# Altium integrated library esd_library.IntLib: 899 symbols (part 1 of 5) (continued)
## Cap Polar-220uF-10V (continued)
CAP 85C 220uF ±20% 10V WX Series Aluminum Electrolytic; MPN: UWX1A221MCL1GB; Name: Cap Polar-220uF-10V; Tan Theta: 0.2; Leakage Current: 22; Rated Ripple Current: 135; PN: 493-2098-1-ND; Diameter: 8; URL: http://www.digikey.ca/product-detail/en/UWX1A221MCL1GB/493-2098-1-ND
footprint CAPACITOR_8MM
pins: 1, 2
1 alternate drawing of the same symbol

## Cap Polar-330uF-4V
designator C?, comment Cap Pol  value 330uF  Voltage: 4V
CAP 85C 330uF ±20% 4V WX Series Aluminum Electrolytic; MPN: UWX0G331MCL1GB; Name: Cap Polar-330uF-4V; Tan Theta: 0.35; Leakage Current: 13.2; Rated Ripple Current: 145; PN: 493-2082-1-ND; Diameter: 8; URL: http://www.digikey.ca/product-detail/en/UWX0G331MCL1GB/493-2082-1-ND
footprint CAPACITOR_8MM
pins: 1, 2
1 alternate drawing of the same symbol

## Cap Polar-330uF-6.3V
designator C?, comment Cap Pol  value 330uF  Voltage: 6.3V
CAP 85C 330uF ±20% 6.3V WX Series Aluminum Electrolytic; MPN: UWX0J331MCL1GB; Name: Cap Polar-330uF-6.3V; Tan Theta: 0.26; Leakage Current: 20.79; Rated Ripple Current: 170; PN: 493-2091-1-ND; Diameter: 8; URL: http://www.digikey.ca/product-detail/en/UWX0J331MCL1GB/493-2091-1-ND
footprint CAPACITOR_8MM
pins: 1, 2
1 alternate drawing of the same symbol


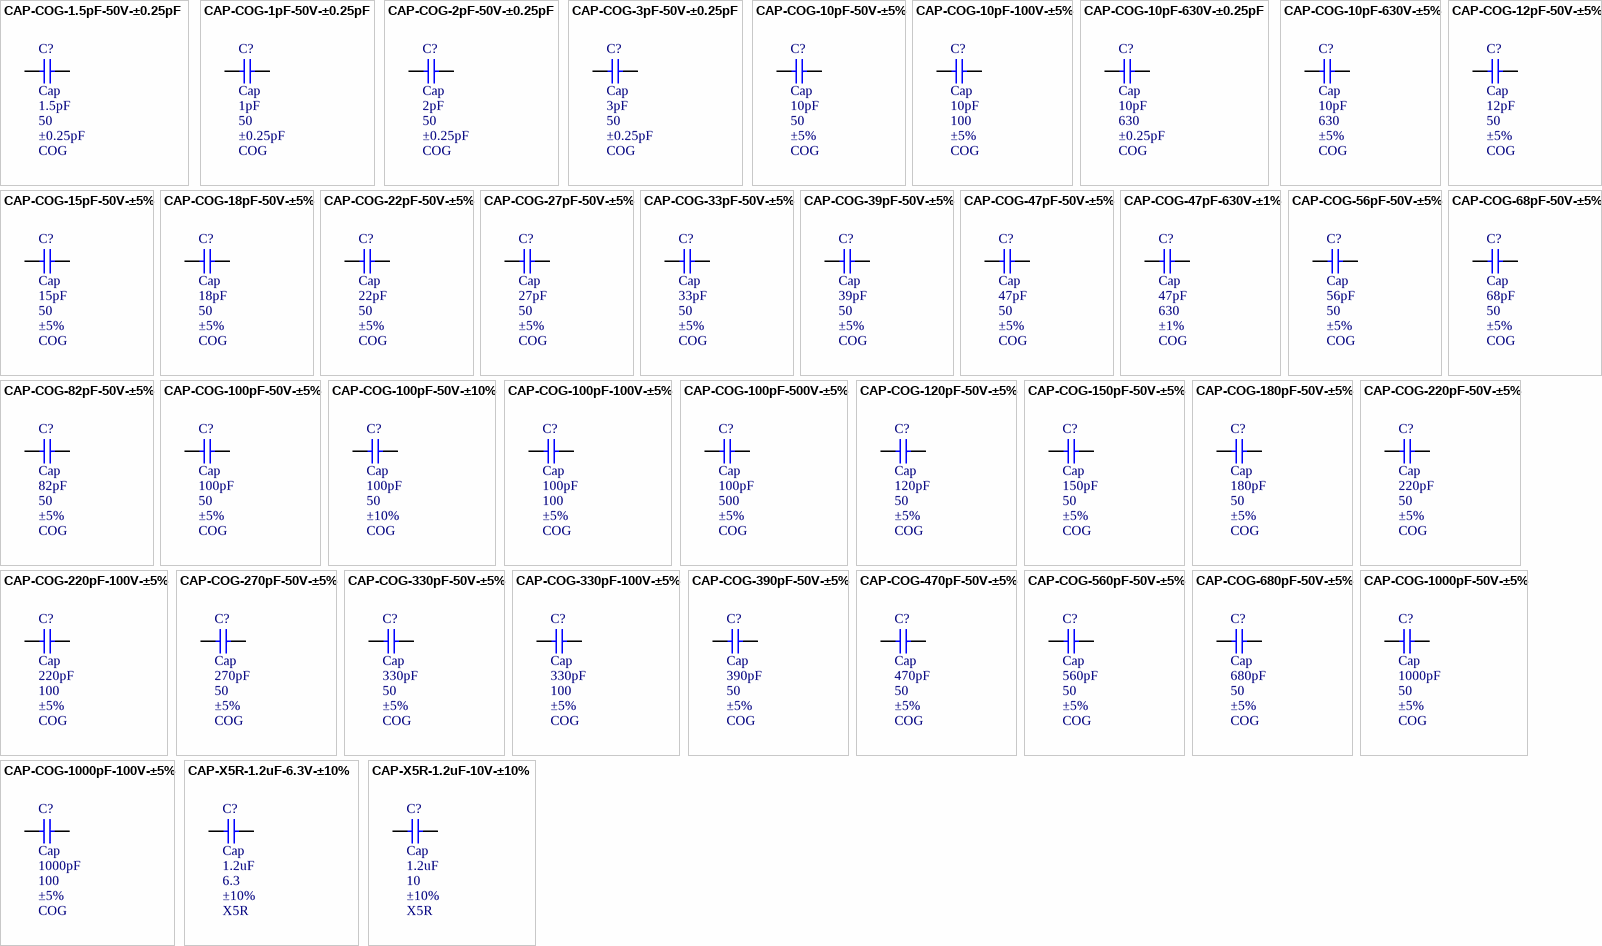
[diagram p4: symbols CAP-COG-1.5pF-50V-±0.25pF to CAP-X5R-1.2uF-10V-±10%]

## CAP-COG-1.5pF-50V-±0.25pF
designator C?, comment Cap  value 1.5pF  WV: 50  Tolerance: ±0.25pF  Type: COG
CAP CER 1.5pF 50v COG 0805; MPN: C0805C159C5GACTU; Name: CAP-COG-1.5pF-50V-±0.25pF; PN: 399-1105-1-ND; URL: http://www.digikey.ca/product-detail/en/C0805C159C5GACTU/399-1105-1-ND
footprint CAPC2012X09M (Chip Capacitor, 2-Leads, Body 2.00x1.25mm, IPC Low Density)
pins: 1, 2

## CAP-COG-1pF-50V-±0.25pF
designator C?, comment Cap  value 1pF  WV: 50  Tolerance: ±0.25pF  Type: COG
CAP CER 1pF 50v COG 0805; MPN: C0805C109C5GACTU; Name: CAP-COG-1pF-50V-±0.25pF; PN: 399-1104-1-ND; URL: http://www.digikey.ca/product-detail/en/C0805C109C5GACTU/399-1104-1-ND
footprint CAPC2012X09M (Chip Capacitor, 2-Leads, Body 2.00x1.25mm, IPC Low Density)
pins: 1, 2

## CAP-COG-2pF-50V-±0.25pF
designator C?, comment Cap  value 2pF  WV: 50  Tolerance: ±0.25pF  Type: COG
CAP CER 2pF 50v COG 0805; MPN: C0805C209C5GACTU; Name: CAP-COG-2pF-50V-±0.25pF; PN: 399-1106-1-ND; URL: http://www.digikey.ca/product-detail/en/C0805C209C5GACTU/399-1106-1-ND
footprint CAPC2012X09M (Chip Capacitor, 2-Leads, Body 2.00x1.25mm, IPC Low Density)
pins: 1, 2

## CAP-COG-3pF-50V-±0.25pF
designator C?, comment Cap  value 3pF  WV: 50  Tolerance: ±0.25pF  Type: COG
CAP CER 3pF 50v COG 0805; MPN: C0805C309C5GACTU; Name: CAP-COG-3pF-50V-±0.25pF; PN: 399-1107-1-ND; URL: http://www.digikey.ca/product-detail/en/C0805C309C5GACTU/399-1107-1-ND
footprint CAPC2012X09M (Chip Capacitor, 2-Leads, Body 2.00x1.25mm, IPC Low Density)
pins: 1, 2

## CAP-COG-10pF-50V-±5%
designator C?, comment Cap  value 10pF  WV: 50  Tolerance: ±5%  Type: COG
CAP CER 10pF 50v COG 0805; MPN: C0805C100J5GACTU; Name: CAP-COG-10pF-50V-±5%; PN: 399-1108-1-ND; URL: http://www.digikey.ca/product-detail/en/C0805C100J5GACTU/399-1108-1-ND
footprint CAPC2012X09M (Chip Capacitor, 2-Leads, Body 2.00x1.25mm, IPC Low Density)
pins: 1, 2

## CAP-COG-10pF-100V-±5%
designator C?, comment Cap  value 10pF  WV: 100  Tolerance: ±5%  Type: COG
CAP CER 10pF 100v COG 0805; MPN: C0805C100J1GACTU; Name: CAP-COG-10pF-100V-±5%; PN: 399-1109-1-ND; URL: http://www.digikey.ca/product-detail/en/C0805C100J1GACTU/399-1109-1-ND
footprint CAPC2012X09M (Chip Capacitor, 2-Leads, Body 2.00x1.25mm, IPC Low Density)
pins: 1, 2

## CAP-COG-10pF-630V-±0.25pF
designator C?, comment Cap  value 10pF  WV: 630  Tolerance: ±0.25pF  Type: COG
CAP CER 10pF 630v COG 0805; MPN: C0805C100CBGACTU; Name: CAP-COG-10pF-630V-±0.25pF; PN: 399-5538-1-ND; URL: http://www.digikey.ca/product-detail/en/C0805C100CBGACTU/399-5538-1-ND
footprint CAPC2012X09M (Chip Capacitor, 2-Leads, Body 2.00x1.25mm, IPC Low Density)
pins: 1, 2

## CAP-COG-10pF-630V-±5%
designator C?, comment Cap  value 10pF  WV: 630  Tolerance: ±5%  Type: COG
CAP CER 10pF 630v COG 0805; MPN: C0805C100JBGACTU; Name: CAP-COG-10pF-630V-±5%; PN: 399-5539-1-ND; URL: http://www.digikey.ca/product-detail/en/C0805C100JBGACTU/399-5539-1-ND
footprint CAPC2012X09M (Chip Capacitor, 2-Leads, Body 2.00x1.25mm, IPC Low Density)
pins: 1, 2

## CAP-COG-12pF-50V-±5%
designator C?, comment Cap  value 12pF  WV: 50  Tolerance: ±5%  Type: COG
CAP CER 12pF 50v COG 0805; MPN: C0805C120J5GACTU; Name: CAP-COG-12pF-50V-±5%; PN: 399-1110-1-ND; URL: http://www.digikey.ca/product-detail/en/C0805C120J5GACTU/399-1110-1-ND
footprint CAPC2012X09M (Chip Capacitor, 2-Leads, Body 2.00x1.25mm, IPC Low Density)
pins: 1, 2

## CAP-COG-15pF-50V-±5%
designator C?, comment Cap  value 15pF  WV: 50  Tolerance: ±5%  Type: COG
CAP CER 15pF 50v COG 0805; MPN: C0805C150J5GACTU; Name: CAP-COG-15pF-50V-±5%; PN: 399-1111-1-ND; URL: http://www.digikey.ca/product-detail/en/C0805C150J5GACTU/399-1111-1-ND
footprint CAPC2012X09M (Chip Capacitor, 2-Leads, Body 2.00x1.25mm, IPC Low Density)
pins: 1, 2

## CAP-COG-18pF-50V-±5%
designator C?, comment Cap  value 18pF  WV: 50  Tolerance: ±5%  Type: COG
CAP CER 18pF 50v COG 0805; MPN: C0805C180J5GACTU; Name: CAP-COG-18pF-50V-±5%; PN: 399-1112-1-ND; URL: http://www.digikey.ca/product-detail/en/C0805C180J5GACTU/399-1112-1-ND
footprint CAPC2012X09M (Chip Capacitor, 2-Leads, Body 2.00x1.25mm, IPC Low Density)
pins: 1, 2

## CAP-COG-22pF-50V-±5%
designator C?, comment Cap  value 22pF  WV: 50  Tolerance: ±5%  Type: COG
CAP CER 22pF 50v COG 0805; MPN: C0805C220J5GACTU; Name: CAP-COG-22pF-50V-±5%; PN: 399-1113-1-ND; URL: http://www.digikey.ca/product-detail/en/C0805C220J5GACTU/399-1113-1-ND
footprint CAPC2012X09M (Chip Capacitor, 2-Leads, Body 2.00x1.25mm, IPC Low Density)
pins: 1, 2

## CAP-COG-27pF-50V-±5%
designator C?, comment Cap  value 27pF  WV: 50  Tolerance: ±5%  Type: COG
CAP CER 27pF 50v COG 0805; MPN: C0805C270J5GACTU; Name: CAP-COG-27pF-50V-±5%; PN: 399-1114-1-ND; URL: http://www.digikey.ca/product-detail/en/C0805C270J5GACTU/399-1114-1-ND
footprint CAPC2012X09M (Chip Capacitor, 2-Leads, Body 2.00x1.25mm, IPC Low Density)
pins: 1, 2

## CAP-COG-33pF-50V-±5%
designator C?, comment Cap  value 33pF  WV: 50  Tolerance: ±5%  Type: COG
CAP CER 33pF 50v COG 0805; MPN: C0805C330J5GACTU; Name: CAP-COG-33pF-50V-±5%; PN: 399-1115-1-ND; URL: http://www.digikey.ca/product-detail/en/C0805C330J5GACTU/399-1115-1-ND
footprint CAPC2012X09M (Chip Capacitor, 2-Leads, Body 2.00x1.25mm, IPC Low Density)
pins: 1, 2

## CAP-COG-39pF-50V-±5%
designator C?, comment Cap  value 39pF  WV: 50  Tolerance: ±5%  Type: COG
CAP CER 39pF 50v COG 0805; MPN: C0805C390J5GACTU; Name: CAP-COG-39pF-50V-±5%; PN: 399-1116-1-ND; URL: http://www.digikey.ca/product-detail/en/C0805C390J5GACTU/399-1116-1-ND
footprint CAPC2012X09M (Chip Capacitor, 2-Leads, Body 2.00x1.25mm, IPC Low Density)
pins: 1, 2

## CAP-COG-47pF-50V-±5%
designator C?, comment Cap  value 47pF  WV: 50  Tolerance: ±5%  Type: COG
CAP CER 47pF 50v COG 0805; MPN: C0805C470J5GACTU; Name: CAP-COG-47pF-50V-±5%; PN: 399-1117-1-ND; URL: http://www.digikey.ca/product-detail/en/C0805C470J5GACTU/399-1117-1-ND
footprint CAPC2012X09M (Chip Capacitor, 2-Leads, Body 2.00x1.25mm, IPC Low Density)
pins: 1, 2

## CAP-COG-47pF-630V-±1%
designator C?, comment Cap  value 47pF  WV: 630  Tolerance: ±1%  Type: COG
CAP CER 47pF 630v COG 0805; MPN: C0805C470FBGACTU; Name: CAP-COG-47pF-630V-±1%; PN: 399-5537-1-ND; URL: http://www.digikey.ca/product-detail/en/C0805C470FBGACTU/399-5537-1-ND
footprint CAPC2012X09M (Chip Capacitor, 2-Leads, Body 2.00x1.25mm, IPC Low Density)
pins: 1, 2

## CAP-COG-56pF-50V-±5%
designator C?, comment Cap  value 56pF  WV: 50  Tolerance: ±5%  Type: COG
CAP CER 56pF 50v COG 0805; MPN: C0805C560J5GACTU; Name: CAP-COG-56pF-50V-±5%; PN: 399-1118-1-ND; URL: http://www.digikey.ca/product-detail/en/C0805C560J5GACTU/399-1118-1-ND
footprint CAPC2012X09M (Chip Capacitor, 2-Leads, Body 2.00x1.25mm, IPC Low Density)
pins: 1, 2

## CAP-COG-68pF-50V-±5%
designator C?, comment Cap  value 68pF  WV: 50  Tolerance: ±5%  Type: COG
CAP CER 68pF 50v COG 0805; MPN: C0805C680J5GACTU; Name: CAP-COG-68pF-50V-±5%; PN: 399-1119-1-ND; URL: http://www.digikey.ca/product-detail/en/C0805C680J5GACTU/399-1119-1-ND
footprint CAPC2012X09M (Chip Capacitor, 2-Leads, Body 2.00x1.25mm, IPC Low Density)
pins: 1, 2

## CAP-COG-82pF-50V-±5%
designator C?, comment Cap  value 82pF  WV: 50  Tolerance: ±5%  Type: COG
CAP CER 82pF 50v COG 0805; MPN: C0805C820J5GACTU; Name: CAP-COG-82pF-50V-±5%; PN: 399-1120-1-ND; URL: http://www.digikey.ca/product-detail/en/C0805C820J5GACTU/399-1120-1-ND
footprint CAPC2012X09M (Chip Capacitor, 2-Leads, Body 2.00x1.25mm, IPC Low Density)
pins: 1, 2

## CAP-COG-100pF-50V-±5%
designator C?, comment Cap  value 100pF  WV: 50  Tolerance: ±5%  Type: COG
CAP CER 100pF 50v COG 0805; MPN: C0805C101J5GACTU; Name: CAP-COG-100pF-50V-±5%; PN: 399-1122-1-ND; URL: http://www.digikey.ca/product-detail/en/C0805C101J5GACTU/399-1122-1-ND
footprint CAPC2012X09M (Chip Capacitor, 2-Leads, Body 2.00x1.25mm, IPC Low Density)
pins: 1, 2

## CAP-COG-100pF-50V-±10%
designator C?, comment Cap  value 100pF  WV: 50  Tolerance: ±10%  Type: COG
CAP CER 100pF 50v COG 0805; MPN: C0805C101K5GACTU; Name: CAP-COG-100pF-50V-±10%; PN: 399-1121-1-ND; URL: http://www.digikey.ca/product-detail/en/C0805C101K5GACTU/399-1121-1-ND
footprint CAPC2012X09M (Chip Capacitor, 2-Leads, Body 2.00x1.25mm, IPC Low Density)
pins: 1, 2

## CAP-COG-100pF-100V-±5%
designator C?, comment Cap  value 100pF  WV: 100  Tolerance: ±5%  Type: COG
CAP CER 100pF 100v COG 0805; MPN: C0805C101J1GACTU; Name: CAP-COG-100pF-100V-±5%; PN: 399-1123-1-ND; URL: http://www.digikey.ca/product-detail/en/C0805C101J1GACTU/399-1123-1-ND
footprint CAPC2012X09M (Chip Capacitor, 2-Leads, Body 2.00x1.25mm, IPC Low Density)
pins: 1, 2

## CAP-COG-100pF-500V-±5%
designator C?, comment Cap  value 100pF  WV: 500  Tolerance: ±5%  Type: COG
CAP CER 100pF 500v COG 0805; MPN: C0805C101JCGACTU; Name: CAP-COG-100pF-500V-±5%; PN: 399-5102-1-ND; URL: http://www.digikey.ca/product-detail/en/C0805C101JCGACTU/399-5102-1-ND
footprint CAPC2012X09M (Chip Capacitor, 2-Leads, Body 2.00x1.25mm, IPC Low Density)
pins: 1, 2

## CAP-COG-120pF-50V-±5%
designator C?, comment Cap  value 120pF  WV: 50  Tolerance: ±5%  Type: COG
CAP CER 120pF 50v COG 0805; MPN: C0805C121J5GACTU; Name: CAP-COG-120pF-50V-±5%; PN: 399-1124-1-ND; URL: http://www.digikey.ca/product-detail/en/C0805C121J5GACTU/399-1124-1-ND
footprint CAPC2012X09M (Chip Capacitor, 2-Leads, Body 2.00x1.25mm, IPC Low Density)
pins: 1, 2

## CAP-COG-150pF-50V-±5%
designator C?, comment Cap  value 150pF  WV: 50  Tolerance: ±5%  Type: COG
CAP CER 150pF 50v COG 0805; MPN: C0805C151J5GACTU; Name: CAP-COG-150pF-50V-±5%; PN: 399-1125-1-ND; URL: http://www.digikey.ca/product-detail/en/C0805C151J5GACTU/399-1125-1-ND
footprint CAPC2012X09M (Chip Capacitor, 2-Leads, Body 2.00x1.25mm, IPC Low Density)
pins: 1, 2

## CAP-COG-180pF-50V-±5%
designator C?, comment Cap  value 180pF  WV: 50  Tolerance: ±5%  Type: COG
CAP CER 180pF 50v COG 0805; MPN: C0805C181J5GACTU; Name: CAP-COG-180pF-50V-±5%; PN: 399-1126-1-ND; URL: http://www.digikey.ca/product-detail/en/C0805C181J5GACTU/399-1126-1-ND
footprint CAPC2012X09M (Chip Capacitor, 2-Leads, Body 2.00x1.25mm, IPC Low Density)
pins: 1, 2

## CAP-COG-220pF-50V-±5%
designator C?, comment Cap  value 220pF  WV: 50  Tolerance: ±5%  Type: COG
CAP CER 220pF 50v COG 0805; MPN: C0805C221J5GACTU; Name: CAP-COG-220pF-50V-±5%; PN: 399-1127-1-ND; URL: http://www.digikey.ca/product-detail/en/C0805C221J5GACTU/399-1127-1-ND
footprint CAPC2012X09M (Chip Capacitor, 2-Leads, Body 2.00x1.25mm, IPC Low Density)
pins: 1, 2

## CAP-COG-220pF-100V-±5%
designator C?, comment Cap  value 220pF  WV: 100  Tolerance: ±5%  Type: COG
CAP CER 220pF 100v COG 0805; MPN: C0805C221J1GACTU; Name: CAP-COG-220pF-100V-±5%; PN: 399-1128-1-ND; URL: http://www.digikey.ca/product-detail/en/C0805C221J1GACTU/399-1128-1-ND
footprint CAPC2012X09M (Chip Capacitor, 2-Leads, Body 2.00x1.25mm, IPC Low Density)
pins: 1, 2

## CAP-COG-270pF-50V-±5%
designator C?, comment Cap  value 270pF  WV: 50  Tolerance: ±5%  Type: COG
CAP CER 270pF 50v COG 0805; MPN: C0805C271J5GACTU; Name: CAP-COG-270pF-50V-±5%; PN: 399-1129-1-ND; URL: http://www.digikey.ca/product-detail/en/C0805C271J5GACTU/399-1129-1-ND
footprint CAPC2012X09M (Chip Capacitor, 2-Leads, Body 2.00x1.25mm, IPC Low Density)
pins: 1, 2

## CAP-COG-330pF-50V-±5%
designator C?, comment Cap  value 330pF  WV: 50  Tolerance: ±5%  Type: COG
CAP CER 330pF 50v COG 0805; MPN: C0805C331J5GACTU; Name: CAP-COG-330pF-50V-±5%; PN: 399-1130-1-ND; URL: http://www.digikey.ca/product-detail/en/C0805C331J5GACTU/399-1130-1-ND
footprint CAPC2012X09M (Chip Capacitor, 2-Leads, Body 2.00x1.25mm, IPC Low Density)
pins: 1, 2

## CAP-COG-330pF-100V-±5%
designator C?, comment Cap  value 330pF  WV: 100  Tolerance: ±5%  Type: COG
CAP CER 330pF 100v COG 0805; MPN: C0805C331J1GACTU; Name: CAP-COG-330pF-100V-±5%; PN: 399-1131-1-ND; URL: http://www.digikey.ca/product-detail/en/C0805C331J1GACTU/399-1131-1-ND
footprint CAPC2012X09M (Chip Capacitor, 2-Leads, Body 2.00x1.25mm, IPC Low Density)
pins: 1, 2

## CAP-COG-390pF-50V-±5%
designator C?, comment Cap  value 390pF  WV: 50  Tolerance: ±5%  Type: COG
CAP CER 390pF 50v COG 0805; MPN: C0805C391J5GACTU; Name: CAP-COG-390pF-50V-±5%; PN: 399-1132-1-ND; URL: http://www.digikey.ca/product-detail/en/C0805C391J5GACTU/399-1132-1-ND
footprint CAPC2012X09M (Chip Capacitor, 2-Leads, Body 2.00x1.25mm, IPC Low Density)
pins: 1, 2

## CAP-COG-470pF-50V-±5%
designator C?, comment Cap  value 470pF  WV: 50  Tolerance: ±5%  Type: COG
CAP CER 470pF 50v COG 0805; MPN: C0805C471J5GACTU; Name: CAP-COG-470pF-50V-±5%; PN: 399-1133-1-ND; URL: http://www.digikey.ca/product-detail/en/C0805C471J5GACTU/399-1133-1-ND
footprint CAPC2012X09M (Chip Capacitor, 2-Leads, Body 2.00x1.25mm, IPC Low Density)
pins: 1, 2

## CAP-COG-560pF-50V-±5%
designator C?, comment Cap  value 560pF  WV: 50  Tolerance: ±5%  Type: COG
CAP CER 560pF 50v COG 0805; MPN: C0805C561J5GACTU; Name: CAP-COG-560pF-50V-±5%; PN: 399-1134-1-ND; URL: http://www.digikey.ca/product-detail/en/C0805C561J5GACTU/399-1134-1-ND
footprint CAPC2012X09M (Chip Capacitor, 2-Leads, Body 2.00x1.25mm, IPC Low Density)
pins: 1, 2

## CAP-COG-680pF-50V-±5%
designator C?, comment Cap  value 680pF  WV: 50  Tolerance: ±5%  Type: COG
CAP CER 680pF 50v COG 0805; MPN: C0805C681J5GACTU; Name: CAP-COG-680pF-50V-±5%; PN: 399-1135-1-ND; URL: http://www.digikey.ca/product-detail/en/C0805C681J5GACTU/399-1135-1-ND
footprint CAPC2012X09M (Chip Capacitor, 2-Leads, Body 2.00x1.25mm, IPC Low Density)
pins: 1, 2

## CAP-COG-1000pF-50V-±5%
designator C?, comment Cap  value 1000pF  WV: 50  Tolerance: ±5%  Type: COG
CAP CER 1000pF 50v COG 0805; MPN: C0805C102J5GACTU; Name: CAP-COG-1000pF-50V-±5%; PN: 399-1136-1-ND; URL: http://www.digikey.ca/product-detail/en/C0805C102J5GACTU/399-1136-1-ND
footprint CAPC2012X09M (Chip Capacitor, 2-Leads, Body 2.00x1.25mm, IPC Low Density)
pins: 1, 2

## CAP-COG-1000pF-100V-±5%
designator C?, comment Cap  value 1000pF  WV: 100  Tolerance: ±5%  Type: COG
CAP CER 1000pF 100v COG 0805; MPN: C0805C102J1GACTU; Name: CAP-COG-1000pF-100V-±5%; PN: 399-1137-1-ND; URL: http://www.digikey.ca/product-detail/en/C0805C102J1GACTU/399-1137-1-ND
footprint CAPC2012X09M (Chip Capacitor, 2-Leads, Body 2.00x1.25mm, IPC Low Density)
pins: 1, 2

## CAP-X5R-1.2uF-6.3V-±10%
designator C?, comment Cap  value 1.2uF  WV: 6.3  Tolerance: ±10%  Type: X5R
CAP CER 1.2uF 6.3v X5R 0805; MPN: C0805C125K9PACTU; Name: CAP-X5R-1.2uF-6.3V-±10%; PN: 399-3120-1-ND; URL: http://www.digikey.ca/product-detail/en/C0805C125K9PACTU/399-3120-1-ND
footprint CAPC2012X09M (Chip Capacitor, 2-Leads, Body 2.00x1.25mm, IPC Low Density)
pins: 1, 2

## CAP-X5R-1.2uF-10V-±10%
designator C?, comment Cap  value 1.2uF  WV: 10  Tolerance: ±10%  Type: X5R
CAP CER 1.2uF 10v X5R 0805; MPN: C0805C125K8PACTU; Name: CAP-X5R-1.2uF-10V-±10%; PN: 399-3119-1-ND; URL: http://www.digikey.ca/product-detail/en/C0805C125K8PACTU/399-3119-1-ND
footprint CAPC2012X09M (Chip Capacitor, 2-Leads, Body 2.00x1.25mm, IPC Low Density)
pins: 1, 2

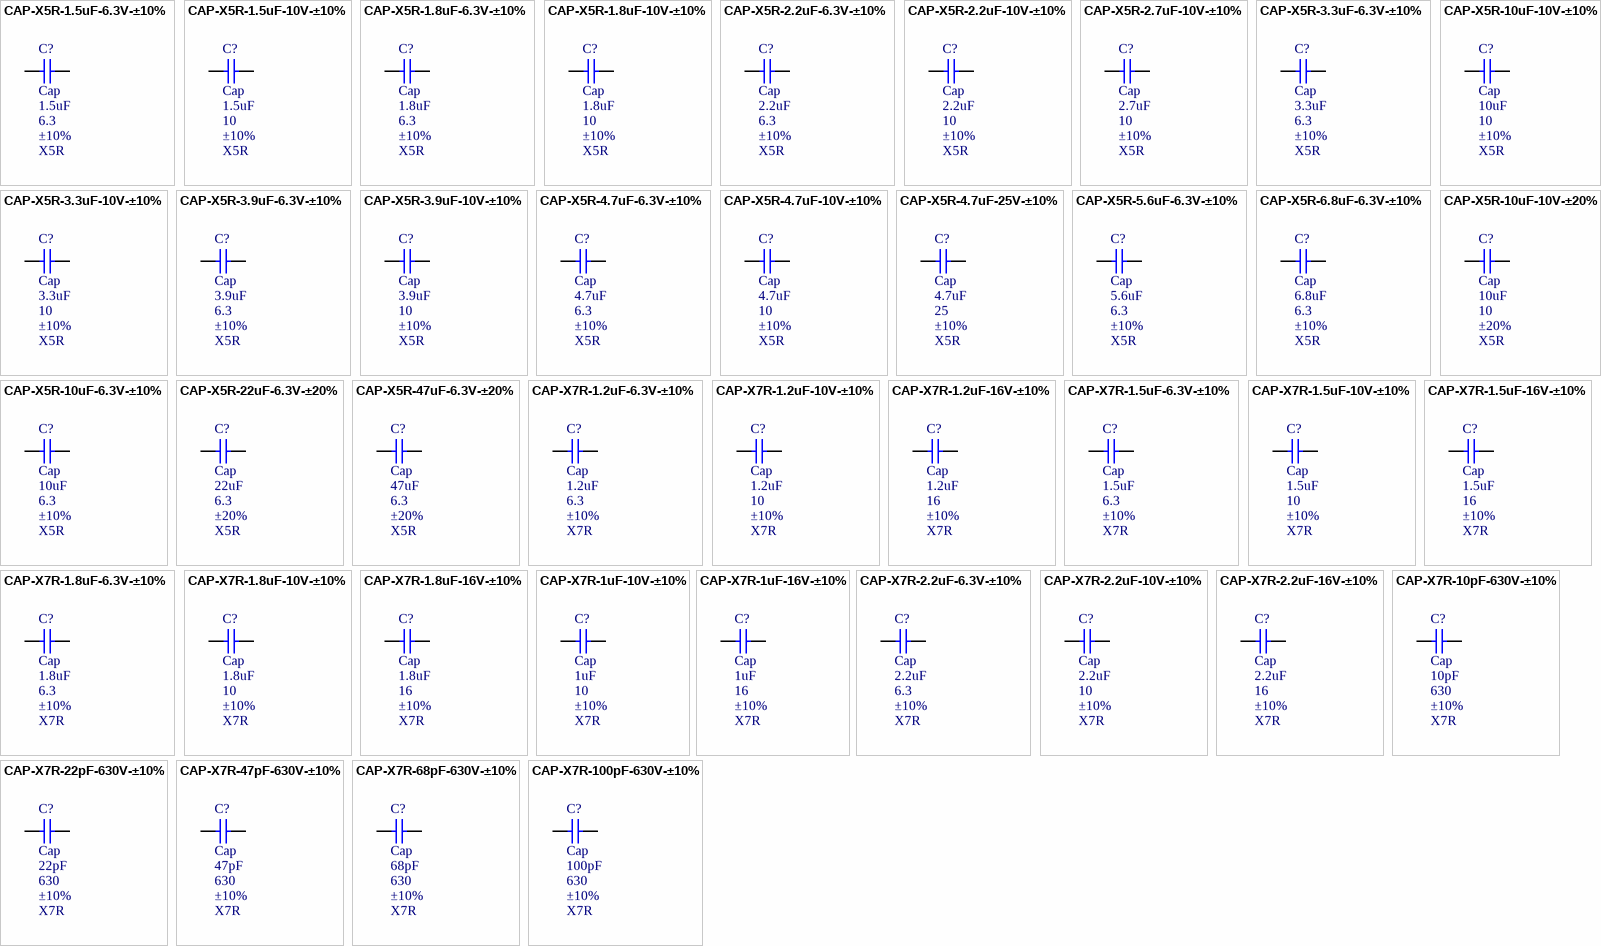
[diagram p5: symbols CAP-X5R-1.5uF-6.3V-±10% to CAP-X7R-100pF-630V-±10%]

## CAP-X5R-1.5uF-6.3V-±10%
designator C?, comment Cap  value 1.5uF  WV: 6.3  Tolerance: ±10%  Type: X5R
CAP CER 1.5uF 6.3v X5R 0805; MPN: C0805C155K9PACTU; Name: CAP-X5R-1.5uF-6.3V-±10%; PN: 399-3122-1-ND; URL: http://www.digikey.ca/product-detail/en/C0805C155K9PACTU/399-3122-1-ND
footprint CAPC2012X09M (Chip Capacitor, 2-Leads, Body 2.00x1.25mm, IPC Low Density)
pins: 1, 2

## CAP-X5R-1.5uF-10V-±10%
designator C?, comment Cap  value 1.5uF  WV: 10  Tolerance: ±10%  Type: X5R
CAP CER 1.5uF 10v X5R 0805; MPN: C0805C155K8PACTU; Name: CAP-X5R-1.5uF-10V-±10%; PN: 399-3121-1-ND; URL: http://www.digikey.ca/product-detail/en/C0805C155K8PACTU/399-3121-1-ND
footprint CAPC2012X09M (Chip Capacitor, 2-Leads, Body 2.00x1.25mm, IPC Low Density)
pins: 1, 2

## CAP-X5R-1.8uF-6.3V-±10%
designator C?, comment Cap  value 1.8uF  WV: 6.3  Tolerance: ±10%  Type: X5R
CAP CER 1.8uF 6.3v X5R 0805; MPN: C0805C185K9PACTU; Name: CAP-X5R-1.8uF-6.3V-±10%; PN: 399-3124-1-ND; URL: http://www.digikey.ca/product-detail/en/C0805C185K9PACTU/399-3124-1-ND
footprint CAPC2012X09M (Chip Capacitor, 2-Leads, Body 2.00x1.25mm, IPC Low Density)
pins: 1, 2

## CAP-X5R-1.8uF-10V-±10%
designator C?, comment Cap  value 1.8uF  WV: 10  Tolerance: ±10%  Type: X5R
CAP CER 1.8uF 10v X5R 0805; MPN: C0805C185K8PACTU; Name: CAP-X5R-1.8uF-10V-±10%; PN: 399-3123-1-ND; URL: http://www.digikey.ca/product-detail/en/C0805C185K8PACTU/399-3123-1-ND
footprint CAPC2012X09M (Chip Capacitor, 2-Leads, Body 2.00x1.25mm, IPC Low Density)
pins: 1, 2

## CAP-X5R-2.2uF-6.3V-±10%
designator C?, comment Cap  value 2.2uF  WV: 6.3  Tolerance: ±10%  Type: X5R
CAP CER 2.2uF 6.3v X5R 0805; MPN: C0805C225K9PACTU; Name: CAP-X5R-2.2uF-6.3V-±10%; PN: 399-3126-1-ND; URL: http://www.digikey.ca/product-detail/en/C0805C225K9PACTU/399-3126-1-ND
footprint CAPC2012X09M (Chip Capacitor, 2-Leads, Body 2.00x1.25mm, IPC Low Density)
pins: 1, 2

## CAP-X5R-2.2uF-10V-±10%
designator C?, comment Cap  value 2.2uF  WV: 10  Tolerance: ±10%  Type: X5R
CAP CER 2.2uF 10v X5R 0805; MPN: C0805C225K8PACTU; Name: CAP-X5R-2.2uF-10V-±10%; PN: 399-3125-1-ND; URL: http://www.digikey.ca/product-detail/en/C0805C225K8PACTU/399-3125-1-ND
footprint CAPC2012X09M (Chip Capacitor, 2-Leads, Body 2.00x1.25mm, IPC Low Density)
pins: 1, 2

## CAP-X5R-2.7uF-10V-±10%
designator C?, comment Cap  value 2.7uF  WV: 10  Tolerance: ±10%  Type: X5R
CAP CER 2.7uF 10v X5R 0805; MPN: C0805C275K8PACTU; Name: CAP-X5R-2.7uF-10V-±10%; PN: 399-3127-1-ND; URL: http://www.digikey.ca/product-detail/en/C0805C275K8PACTU/399-3127-1-ND
footprint CAPC2012X09M (Chip Capacitor, 2-Leads, Body 2.00x1.25mm, IPC Low Density)
pins: 1, 2

## CAP-X5R-3.3uF-6.3V-±10%
designator C?, comment Cap  value 3.3uF  WV: 6.3  Tolerance: ±10%  Type: X5R
CAP CER 3.3uF 6.3v X5R 0805; MPN: C0805C335K9PACTU; Name: CAP-X5R-3.3uF-6.3V-±10%; PN: 399-3130-1-ND; URL: http://www.digikey.ca/product-detail/en/C0805C335K9PACTU/399-3130-1-ND
footprint CAPC2012X09M (Chip Capacitor, 2-Leads, Body 2.00x1.25mm, IPC Low Density)
pins: 1, 2

## CAP-X5R-3.3uF-10V-±10%
designator C?, comment Cap  value 3.3uF  WV: 10  Tolerance: ±10%  Type: X5R
CAP CER 3.3uF 10v X5R 0805; MPN: C0805C335K8PACTU; Name: CAP-X5R-3.3uF-10V-±10%; PN: 399-3129-1-ND; URL: http://www.digikey.ca/product-detail/en/C0805C335K8PACTU/399-3129-1-ND
footprint CAPC2012X09M (Chip Capacitor, 2-Leads, Body 2.00x1.25mm, IPC Low Density)
pins: 1, 2

## CAP-X5R-3.9uF-6.3V-±10%
designator C?, comment Cap  value 3.9uF  WV: 6.3  Tolerance: ±10%  Type: X5R
CAP CER 3.9uF 6.3v X5R 0805; MPN: C0805C395K9PACTU; Name: CAP-X5R-3.9uF-6.3V-±10%; PN: 399-3132-1-ND; URL: http://www.digikey.ca/product-detail/en/C0805C395K9PACTU/399-3132-1-ND
footprint CAPC2012X09M (Chip Capacitor, 2-Leads, Body 2.00x1.25mm, IPC Low Density)
pins: 1, 2

## CAP-X5R-3.9uF-10V-±10%
designator C?, comment Cap  value 3.9uF  WV: 10  Tolerance: ±10%  Type: X5R
CAP CER 3.9uF 10v X5R 0805; MPN: C0805C395K8PACTU; Name: CAP-X5R-3.9uF-10V-±10%; PN: 399-3131-1-ND; URL: http://www.digikey.ca/product-detail/en/C0805C395K8PACTU/399-3131-1-ND
footprint CAPC2012X09M (Chip Capacitor, 2-Leads, Body 2.00x1.25mm, IPC Low Density)
pins: 1, 2

## CAP-X5R-4.7uF-6.3V-±10%
designator C?, comment Cap  value 4.7uF  WV: 6.3  Tolerance: ±10%  Type: X5R
CAP CER 4.7uF 6.3v X5R 0805; MPN: C0805C475K9PACTU; Name: CAP-X5R-4.7uF-6.3V-±10%; PN: 399-3134-1-ND; URL: http://www.digikey.ca/product-detail/en/C0805C475K9PACTU/399-3134-1-ND
footprint CAPC2012X09M (Chip Capacitor, 2-Leads, Body 2.00x1.25mm, IPC Low Density)
pins: 1, 2

## CAP-X5R-4.7uF-10V-±10%
designator C?, comment Cap  value 4.7uF  WV: 10  Tolerance: ±10%  Type: X5R
CAP CER 4.7uF 10v X5R 0805; MPN: C0805C475K8PACTU; Name: CAP-X5R-4.7uF-10V-±10%; PN: 399-3133-1-ND; URL: http://www.digikey.ca/product-detail/en/C0805C475K8PACTU/399-3133-1-ND
footprint CAPC2012X09M (Chip Capacitor, 2-Leads, Body 2.00x1.25mm, IPC Low Density)
pins: 1, 2

## CAP-X5R-4.7uF-25V-±10%
designator C?, comment Cap  value 4.7uF  WV: 25  Tolerance: ±10%  Type: X5R
CAP CER 4.7uF 25v X5R 0805; MPN: C0805C475K3PACTU; Name: CAP-X5R-4.7uF-25V-±10%; PN: 399-5505-1-ND; URL: http://www.digikey.ca/product-detail/en/C0805C475K3PACTU/399-5505-1-ND
footprint CAPC2012X09M (Chip Capacitor, 2-Leads, Body 2.00x1.25mm, IPC Low Density)
pins: 1, 2

## CAP-X5R-5.6uF-6.3V-±10%
designator C?, comment Cap  value 5.6uF  WV: 6.3  Tolerance: ±10%  Type: X5R
CAP CER 5.6uF 6.3v X5R 0805; MPN: C0805C565K9PACTU; Name: CAP-X5R-5.6uF-6.3V-±10%; PN: 399-3135-1-ND; URL: http://www.digikey.ca/product-detail/en/C0805C565K9PACTU/399-3135-1-ND
footprint CAPC2012X09M (Chip Capacitor, 2-Leads, Body 2.00x1.25mm, IPC Low Density)
pins: 1, 2

## CAP-X5R-6.8uF-6.3V-±10%
designator C?, comment Cap  value 6.8uF  WV: 6.3  Tolerance: ±10%  Type: X5R
CAP CER 6.8uF 6.3v X5R 0805; MPN: C0805C685K9PACTU; Name: CAP-X5R-6.8uF-6.3V-±10%; PN: 399-3136-1-ND; URL: http://www.digikey.ca/product-detail/en/C0805C685K9PACTU/399-3136-1-ND
footprint CAPC2012X09M (Chip Capacitor, 2-Leads, Body 2.00x1.25mm, IPC Low Density)
pins: 1, 2

## CAP-X5R-10uF-6.3V-±10%
designator C?, comment Cap  value 10uF  WV: 6.3  Tolerance: ±10%  Type: X5R
CAP CER 10uF 6.3v X5R 0805; MPN: C0805C106K9PACTU; Name: CAP-X5R-10uF-6.3V-±10%; PN: 399-3138-1-ND; URL: http://www.digikey.ca/product-detail/en/C0805C106K9PACTU/399-3138-1-ND
footprint CAPC2012X09M (Chip Capacitor, 2-Leads, Body 2.00x1.25mm, IPC Low Density)
pins: 1, 2

## CAP-X5R-10uF-10V-±10%
designator C?, comment Cap  value 10uF  WV: 10  Tolerance: ±10%  Type: X5R
CAP CER 10uF 10v X5R 0805; MPN: C0805C106K8PACTU; Name: CAP-X5R-10uF-10V-±10%; PN: 399-4925-1-ND; URL: http://www.digikey.ca/product-detail/en/C0805C106K8PACTU/399-4925-1-ND
footprint CAPC2012X09M (Chip Capacitor, 2-Leads, Body 2.00x1.25mm, IPC Low Density)
pins: 1, 2

## CAP-X5R-10uF-10V-±20%
designator C?, comment Cap  value 10uF  WV: 10  Tolerance: ±20%  Type: X5R
CAP CER 10uF 10v X5R 0805; MPN: C0805C106M8PACTU; Name: CAP-X5R-10uF-10V-±20%; PN: 399-4926-1-ND; URL: http://www.digikey.ca/product-detail/en/C0805C106M8PACTU/399-4926-1-ND
footprint CAPC2012X09M (Chip Capacitor, 2-Leads, Body 2.00x1.25mm, IPC Low Density)
pins: 1, 2

## CAP-X5R-22uF-6.3V-±20%
designator C?, comment Cap  value 22uF  WV: 6.3  Tolerance: ±20%  Type: X5R
CAP CER 22uF 6.3v X5R 0805; MPN: C0805C226M9PACTU; Name: CAP-X5R-22uF-6.3V-±20%; PN: 399-4696-1-ND; URL: http://www.digikey.ca/product-detail/en/C0805C226M9PACTU/399-4696-1-ND
footprint CAPC2012X09M (Chip Capacitor, 2-Leads, Body 2.00x1.25mm, IPC Low Density)
pins: 1, 2

## CAP-X5R-47uF-6.3V-±20%
designator C?, comment Cap  value 47uF  WV: 6.3  Tolerance: ±20%  Type: X5R
CAP CER 47uF 6.3v X5R 0805; MPN: C0805C476M9PACTU; Name: CAP-X5R-47uF-6.3V-±20%; PN: 399-5506-1-ND; URL: http://www.digikey.ca/product-detail/en/C0805C476M9PACTU/399-5506-1-ND
footprint CAPC2012X09M (Chip Capacitor, 2-Leads, Body 2.00x1.25mm, IPC Low Density)
pins: 1, 2

## CAP-X7R-1.2uF-6.3V-±10%
designator C?, comment Cap  value 1.2uF  WV: 6.3  Tolerance: ±10%  Type: X7R
CAP CER 1.2uF 6.3v X7R 0805; MPN: C0805C125K9RACTU; Name: CAP-X7R-1.2uF-6.3V-±10%; PN: 399-4929-1-ND; URL: http://www.digikey.ca/product-detail/en/C0805C125K9RACTU/399-4929-1-ND
footprint CAPC2012X09M (Chip Capacitor, 2-Leads, Body 2.00x1.25mm, IPC Low Density)
pins: 1, 2

## CAP-X7R-1.2uF-10V-±10%
designator C?, comment Cap  value 1.2uF  WV: 10  Tolerance: ±10%  Type: X7R
CAP CER 1.2uF 10v X7R 0805; MPN: C0805C125K8RACTU; Name: CAP-X7R-1.2uF-10V-±10%; PN: 399-4928-1-ND; URL: http://www.digikey.ca/product-detail/en/C0805C125K8RACTU/399-4928-1-ND
footprint CAPC2012X09M (Chip Capacitor, 2-Leads, Body 2.00x1.25mm, IPC Low Density)
pins: 1, 2

## CAP-X7R-1.2uF-16V-±10%
designator C?, comment Cap  value 1.2uF  WV: 16  Tolerance: ±10%  Type: X7R
CAP CER 1.2uF 16v X7R 0805; MPN: C0805C125K4RACTU; Name: CAP-X7R-1.2uF-16V-±10%; PN: 399-4927-1-ND; URL: http://www.digikey.ca/product-detail/en/C0805C125K4RACTU/399-4927-1-ND
footprint CAPC2012X09M (Chip Capacitor, 2-Leads, Body 2.00x1.25mm, IPC Low Density)
pins: 1, 2

## CAP-X7R-1.5uF-6.3V-±10%
designator C?, comment Cap  value 1.5uF  WV: 6.3  Tolerance: ±10%  Type: X7R
CAP CER 1.5uF 6.3v X7R 0805; MPN: C0805C155K9RACTU; Name: CAP-X7R-1.5uF-6.3V-±10%; PN: 399-4932-1-ND; URL: http://www.digikey.ca/product-detail/en/C0805C155K9RACTU/399-4932-1-ND
footprint CAPC2012X09M (Chip Capacitor, 2-Leads, Body 2.00x1.25mm, IPC Low Density)
pins: 1, 2

## CAP-X7R-1.5uF-10V-±10%
designator C?, comment Cap  value 1.5uF  WV: 10  Tolerance: ±10%  Type: X7R
CAP CER 1.5uF 10v X7R 0805; MPN: C0805C155K8RACTU; Name: CAP-X7R-1.5uF-10V-±10%; PN: 399-4931-1-ND; URL: http://www.digikey.ca/product-detail/en/C0805C155K8RACTU/399-4931-1-ND
footprint CAPC2012X09M (Chip Capacitor, 2-Leads, Body 2.00x1.25mm, IPC Low Density)
pins: 1, 2

## CAP-X7R-1.5uF-16V-±10%
designator C?, comment Cap  value 1.5uF  WV: 16  Tolerance: ±10%  Type: X7R
CAP CER 1.5uF 16v X7R 0805; MPN: C0805C155K4RACTU; Name: CAP-X7R-1.5uF-16V-±10%; PN: 399-4930-1-ND; URL: http://www.digikey.ca/product-detail/en/C0805C155K4RACTU/399-4930-1-ND
footprint CAPC2012X09M (Chip Capacitor, 2-Leads, Body 2.00x1.25mm, IPC Low Density)
pins: 1, 2

## CAP-X7R-1.8uF-6.3V-±10%
designator C?, comment Cap  value 1.8uF  WV: 6.3  Tolerance: ±10%  Type: X7R
CAP CER 1.8uF 6.3v X7R 0805; MPN: C0805C185K9RACTU; Name: CAP-X7R-1.8uF-6.3V-±10%; PN: 399-4935-1-ND; URL: http://www.digikey.ca/product-detail/en/C0805C185K9RACTU/399-4935-1-ND
footprint CAPC2012X09M (Chip Capacitor, 2-Leads, Body 2.00x1.25mm, IPC Low Density)
pins: 1, 2

## CAP-X7R-1.8uF-10V-±10%
designator C?, comment Cap  value 1.8uF  WV: 10  Tolerance: ±10%  Type: X7R
CAP CER 1.8uF 10v X7R 0805; MPN: C0805C185K8RACTU; Name: CAP-X7R-1.8uF-10V-±10%; PN: 399-4934-1-ND; URL: http://www.digikey.ca/product-detail/en/C0805C185K8RACTU/399-4934-1-ND
footprint CAPC2012X09M (Chip Capacitor, 2-Leads, Body 2.00x1.25mm, IPC Low Density)
pins: 1, 2

## CAP-X7R-1.8uF-16V-±10%
designator C?, comment Cap  value 1.8uF  WV: 16  Tolerance: ±10%  Type: X7R
CAP CER 1.8uF 16v X7R 0805; MPN: C0805C185K4RACTU; Name: CAP-X7R-1.8uF-16V-±10%; PN: 399-4933-1-ND; URL: http://www.digikey.ca/product-detail/en/C0805C185K4RACTU/399-4933-1-ND
footprint CAPC2012X09M (Chip Capacitor, 2-Leads, Body 2.00x1.25mm, IPC Low Density)
pins: 1, 2

## CAP-X7R-1uF-10V-±10%
designator C?, comment Cap  value 1uF  WV: 10  Tolerance: ±10%  Type: X7R
CAP CER 1uF 10v X7R 0805; MPN: C0805C105K8RACTU; Name: CAP-X7R-1uF-10V-±10%; PN: 399-1172-1-ND; URL: http://www.digikey.ca/product-detail/en/C0805C105K8RACTU/399-1172-1-ND
footprint CAPC2012X09M (Chip Capacitor, 2-Leads, Body 2.00x1.25mm, IPC Low Density)
pins: 1, 2

## CAP-X7R-1uF-16V-±10%
designator C?, comment Cap  value 1uF  WV: 16  Tolerance: ±10%  Type: X7R
CAP CER 1uF 16v X7R 0805; MPN: C0805C105K4RACTU; Name: CAP-X7R-1uF-16V-±10%; PN: 399-1284-1-ND; URL: http://www.digikey.ca/product-detail/en/C0805C105K4RACTU/399-1284-1-ND
footprint CAPC2012X09M (Chip Capacitor, 2-Leads, Body 2.00x1.25mm, IPC Low Density)
pins: 1, 2

## CAP-X7R-2.2uF-6.3V-±10%
designator C?, comment Cap  value 2.2uF  WV: 6.3  Tolerance: ±10%  Type: X7R
CAP CER 2.2uF 6.3v X7R 0805; MPN: C0805C225K9RACTU; Name: CAP-X7R-2.2uF-6.3V-±10%; PN: 399-4936-1-ND; URL: http://www.digikey.ca/product-detail/en/C0805C225K9RACTU/399-4936-1-ND
footprint CAPC2012X09M (Chip Capacitor, 2-Leads, Body 2.00x1.25mm, IPC Low Density)
pins: 1, 2

## CAP-X7R-2.2uF-10V-±10%
designator C?, comment Cap  value 2.2uF  WV: 10  Tolerance: ±10%  Type: X7R
CAP CER 2.2uF 10v X7R 0805; MPN: C0805C225K8RACTU; Name: CAP-X7R-2.2uF-10V-±10%; PN: 399-3522-1-ND; URL: http://www.digikey.ca/product-detail/en/C0805C225K8RACTU/399-3522-1-ND
footprint CAPC2012X09M (Chip Capacitor, 2-Leads, Body 2.00x1.25mm, IPC Low Density)
pins: 1, 2

## CAP-X7R-2.2uF-16V-±10%
designator C?, comment Cap  value 2.2uF  WV: 16  Tolerance: ±10%  Type: X7R
CAP CER 2.2uF 16v X7R 0805; MPN: C0805C225K4RACTU; Name: CAP-X7R-2.2uF-16V-±10%; PN: 399-3523-1-ND; URL: http://www.digikey.ca/product-detail/en/C0805C225K4RACTU/399-3523-1-ND
footprint CAPC2012X09M (Chip Capacitor, 2-Leads, Body 2.00x1.25mm, IPC Low Density)
pins: 1, 2

## CAP-X7R-10pF-630V-±10%
designator C?, comment Cap  value 10pF  WV: 630  Tolerance: ±10%  Type: X7R
CAP CER 10pF 630v X7R 0805; MPN: C0805C100KBRACTU; Name: CAP-X7R-10pF-630V-±10%; PN: 399-5567-1-ND; URL: http://www.digikey.ca/product-detail/en/C0805C100KBRACTU/399-5567-1-ND
footprint CAPC2012X09M (Chip Capacitor, 2-Leads, Body 2.00x1.25mm, IPC Low Density)
pins: 1, 2

## CAP-X7R-22pF-630V-±10%
designator C?, comment Cap  value 22pF  WV: 630  Tolerance: ±10%  Type: X7R
CAP CER 22pF 630v X7R 0805; MPN: C0805C220KBRACTU; Name: CAP-X7R-22pF-630V-±10%; PN: 399-5568-1-ND; URL: http://www.digikey.ca/product-detail/en/C0805C220KBRACTU/399-5568-1-ND
footprint CAPC2012X09M (Chip Capacitor, 2-Leads, Body 2.00x1.25mm, IPC Low Density)
pins: 1, 2

## CAP-X7R-47pF-630V-±10%
designator C?, comment Cap  value 47pF  WV: 630  Tolerance: ±10%  Type: X7R
CAP CER 47pF 630v X7R 0805; MPN: C0805C470KBRACTU; Name: CAP-X7R-47pF-630V-±10%; PN: 399-5569-1-ND; URL: http://www.digikey.ca/product-detail/en/C0805C470KBRACTU/399-5569-1-ND
footprint CAPC2012X09M (Chip Capacitor, 2-Leads, Body 2.00x1.25mm, IPC Low Density)
pins: 1, 2

## CAP-X7R-68pF-630V-±10%
designator C?, comment Cap  value 68pF  WV: 630  Tolerance: ±10%  Type: X7R
CAP CER 68pF 630v X7R 0805; MPN: C0805C680KBRACTU; Name: CAP-X7R-68pF-630V-±10%; PN: 399-5570-1-ND; URL: http://www.digikey.ca/product-detail/en/C0805C680KBRACTU/399-5570-1-ND
footprint CAPC2012X09M (Chip Capacitor, 2-Leads, Body 2.00x1.25mm, IPC Low Density)
pins: 1, 2

## CAP-X7R-100pF-630V-±10%
designator C?, comment Cap  value 100pF  WV: 630  Tolerance: ±10%  Type: X7R
CAP CER 100pF 630v X7R 0805; MPN: C0805C101KBRACTU; Name: CAP-X7R-100pF-630V-±10%; PN: 399-5571-1-ND; URL: http://www.digikey.ca/product-detail/en/C0805C101KBRACTU/399-5571-1-ND
footprint CAPC2012X09M (Chip Capacitor, 2-Leads, Body 2.00x1.25mm, IPC Low Density)
pins: 1, 2

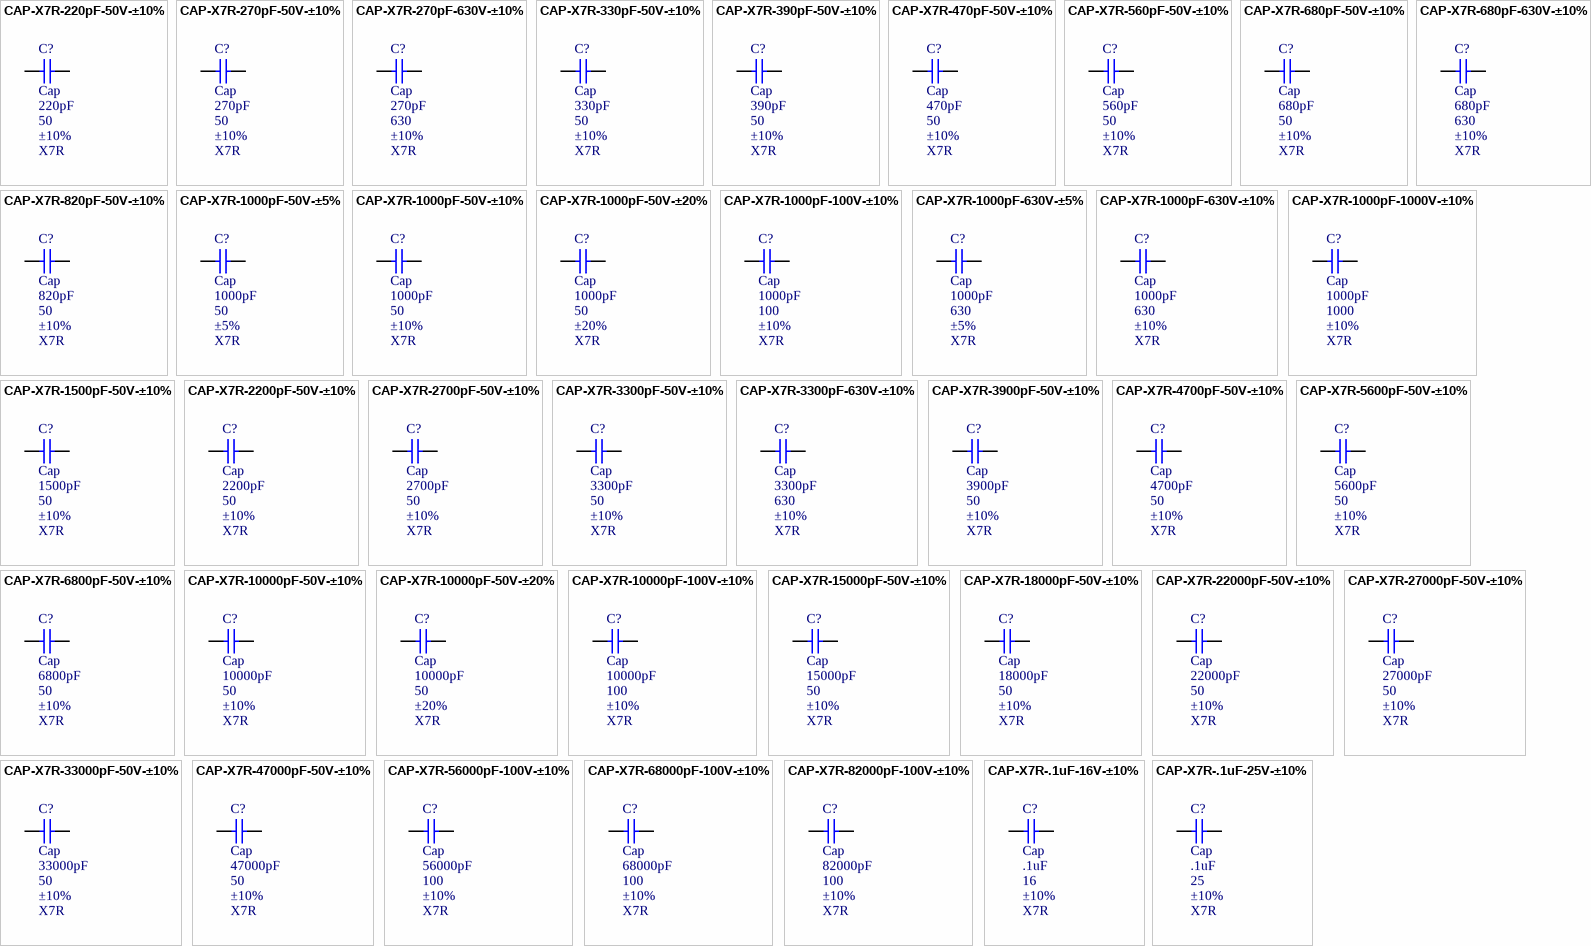
[diagram p6: symbols CAP-X7R-220pF-50V-±10% to CAP-X7R-.1uF-25V-±10%]

## CAP-X7R-220pF-50V-±10%
designator C?, comment Cap  value 220pF  WV: 50  Tolerance: ±10%  Type: X7R
CAP CER 220pF 50v X7R 0805; MPN: C0805C221K5RACTU; Name: CAP-X7R-220pF-50V-±10%; PN: 399-1138-1-ND; URL: http://www.digikey.ca/product-detail/en/C0805C221K5RACTU/399-1138-1-ND
footprint CAPC2012X09M (Chip Capacitor, 2-Leads, Body 2.00x1.25mm, IPC Low Density)
pins: 1, 2

## CAP-X7R-270pF-50V-±10%
designator C?, comment Cap  value 270pF  WV: 50  Tolerance: ±10%  Type: X7R
CAP CER 270pF 50v X7R 0805; MPN: C0805C271K5RACTU; Name: CAP-X7R-270pF-50V-±10%; PN: 399-1139-1-ND; URL: http://www.digikey.ca/product-detail/en/C0805C271K5RACTU/399-1139-1-ND
footprint CAPC2012X09M (Chip Capacitor, 2-Leads, Body 2.00x1.25mm, IPC Low Density)
pins: 1, 2